# Altium footprint library myPcbLib.PcbLib: 987 footprints (part 62 of 62)
Each footprint in its own frame and in the unit in brackets; x right, y up, seen from the top. Pads: shape width x height; smd on the part's side, far side on the other; paste and mask are expansions set on the pad; w line width, h text height; cw(c..) or ccw(c..) is an arc to the next point about the centre after c.
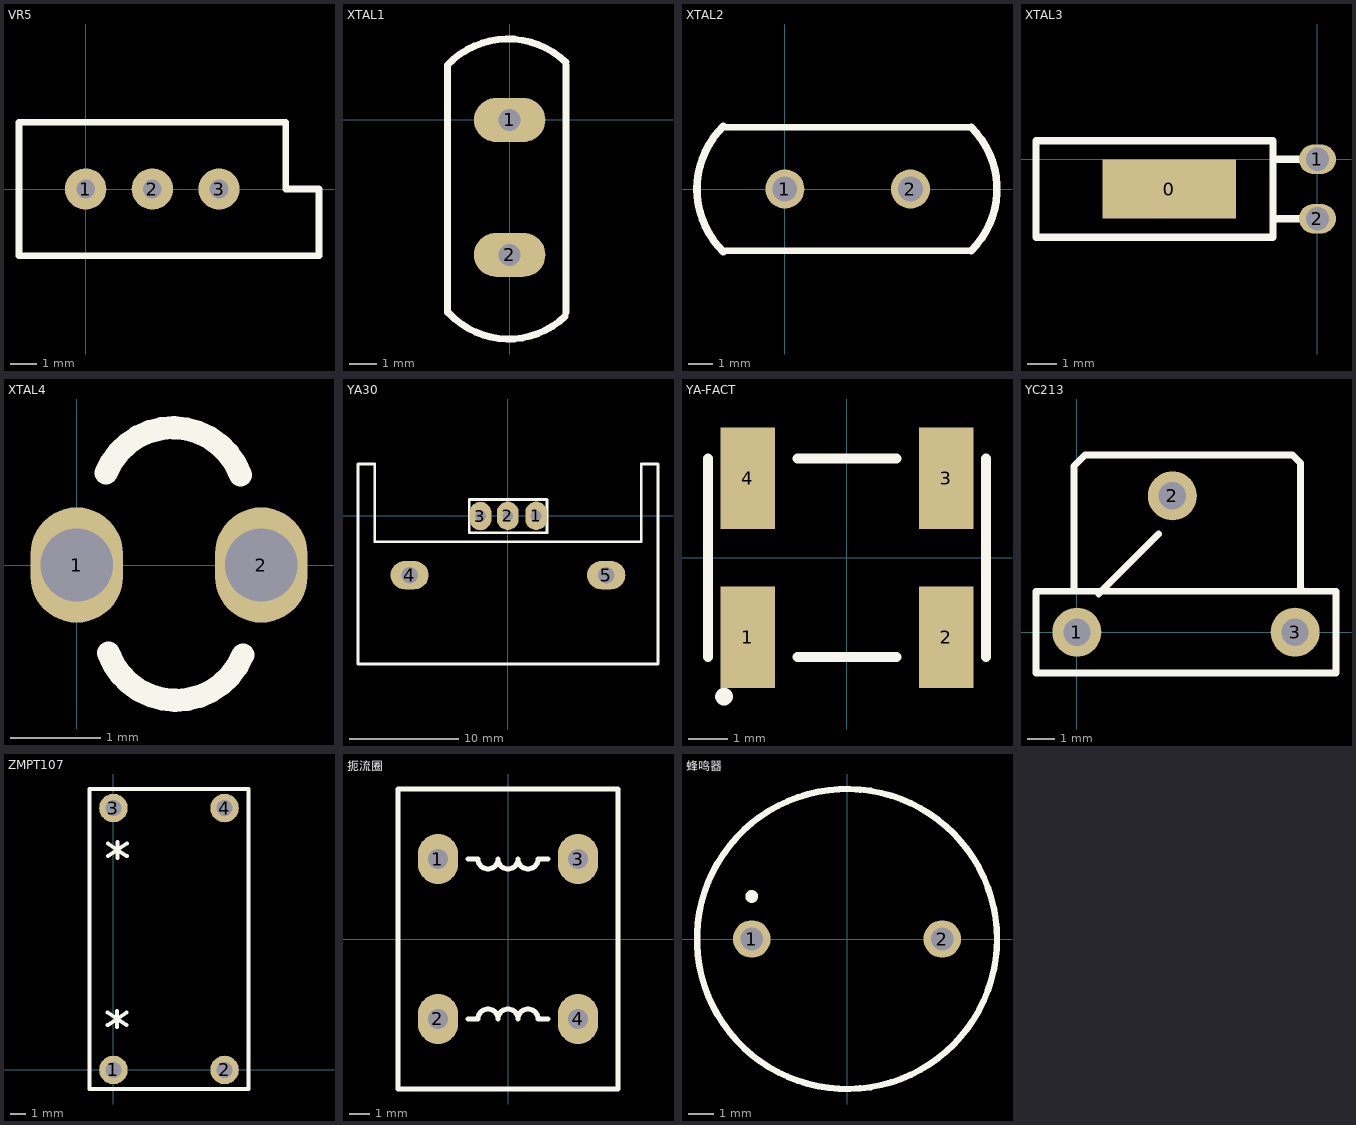
[diagram p61: the footprints below, top view; thin cyan lines are the x and y axes]

## VR5 [mil]
pads (3):
  round 62 hole 28: 1(0,0) 2(100,0) 3(200,0)
Top Overlay:
  lines w10: -100,-100 -100,100 300,100 300,0 350,0 350,-100 -100,-100

## XTAL1 [mm]
pads (2):
  oval 2.6x1.6 hole 0.8: 1(0,0) 2(0,-4.9)
Top Overlay:
  lines w0.254: -2.26,-7 -2.26,2 cw(c-0.06,-0.1) 2.04,2.1 ; -2.19,-7.04 ccw(c-0.04,-4.99) 2.01,-7.14 ; 2.04,-7 2.04,2

## XTAL2 [mil]
pads (2):
  round 62 hole 39.37: 1(0,0) 2(200,0)
Top Overlay:
  lines w10: -96.85,-98.43 296.85,-98.43 ; -96.85,98.42 296.85,98.42
  lines w12: -98.1,-99.7 cw(c0,0) -98.1,99.7 ; 296.59,-98.16 ccw(c200,0) 296.59,98.16

## XTAL3 [mil]
pads (3):
  rect 180x80 smd: 0(-200,-40)
  oval 50x40 hole 31.5: 1(0,0) 2(0,-80)
Top Overlay:
  lines w10: -60,-80 0,-80 ; -60,0 0,0 ; -380,-105 -380,25 -60,25 -60,-105 -380,-105

## XTAL4 [mil]
pads (2):
  oval 40x50 hole 31.5: 1(0,0) 2(80,0)
Top Overlay:
  lines w10: 12.7,39.9 cw(c41.68,28.29) 71,39 ; 13.7,-38.1 ccw(c43.02,-27.39) 72,-39

## YA30 [mm]
pads (5):
  oval 2x2.6 hole 1: 1(2.6,0) 2(0,0) 3(-2.5,-0.024)
  oval 3.5x2.6 hole 1.5: 4(-8.98,-5.42) 5(9,-5.42)
Top Overlay:
  lines w0.254: -12.172,-1.864 -12.172,4.74 -13.696,4.74 -13.696,-13.548 -12.68,-13.548 12.72,-13.548 13.228,-13.548 13.736,-13.548 13.736,4.74 12.72,4.74 12.212,4.74 12.212,-1.864 ; -12.172,-1.356 -12.172,-2.372 -11.664,-2.372 11.704,-2.372 12.212,-2.372 12.212,-1.356 ; -3.516,-1.548 3.596,-1.548 3.596,-0.024 3.596,1.5 -3.516,1.5 -3.516,-1.548

## YA-FACT [mm]
pads (4):
  rect 1.4x2.6 smd: 1(-2.54,-2.032) 2(2.54,-2.032) 3(2.54,2.032) 4(-2.54,2.032)
Top Overlay:
  circle w0.254: c-3.148,-3.556 r0.1
  lines w0.254: -3.556,-2.54 -3.556,2.54 ; -1.27,-2.54 1.27,-2.54 ; -1.27,2.54 1.27,2.54 ; 3.556,-2.54 3.556,2.54

## YC213 [mm]
pads (3):
  round 1.8 hole 1: 1(0,0) 2(3.5,5) 3(8,0)
Top Overlay:
  lines w0.254: -0.1,1.5 -0.1,6.1 0.3,6.5 7.9,6.5 8.2,6.2 8.2,1.6 8.3,1.5 ; 0.8,1.4 3,3.6 ; -1.5,-1.5 -1.5,1.5 9.5,1.5 9.5,-1.5 -1.5,-1.5

## ZMPT107 [mm]
pads (4):
  round 1.8 hole 1: 1(0,0) 2(7,0) 3(0,16.5) 4(7,16.5)
Top Overlay:
  lines w0.254: -0.373,2.818 0.827,3.618 ; -0.373,3.618 0.827,2.818 ; -0.351,13.468 0.849,14.268 ; -0.351,14.268 0.849,13.468 ; 0.227,2.718 0.227,3.718 ; 0.249,13.368 0.249,14.367 ; -1.5,-1.2 -1.5,17.7 8.5,17.7 8.5,-1.2 -1.5,-1.2

## 扼流圈 [mm]
pads (4):
  oval 2x2.5 hole 1: 1(-3.5,4) 2(-3.5,-4) 3(3.5,4) 4(3.5,-4)
Top Overlay:
  lines w0.254: -2,-4 -1.5,-4 cw(c-1,-4) -0.5,-4 cw(c0,-4) 0.5,-4 cw(c1,-4) 1.5,-4 2,-4 ; -2,4 -1.5,4 ccw(c-1,4) -0.5,4 ccw(c0,4) 0.5,4 ccw(c1,4) 1.5,4 2,4 ; -5.5,-7.5 -5.5,7.5 5.5,7.5 5.5,-7.5 -5.5,-7.5

## 蜂鸣器 [mm]
pads (2):
  round 1.5 hole 0.9: 1(-3.81,0) 2(3.81,0)
Top Overlay:
  circle w0.254: c0,0 r6
  circle w0.254: c-3.813,1.702 r0.13